# Altium footprint library STM32F0.PcbLib: 228 footprints (part 10 of 16)
Each footprint in its own frame and in the unit in brackets; x right, y up, seen from the top. Pads: shape width x height; smd on the part's side, far side on the other; paste and mask are expansions set on the pad; w line width, h text height; cw(c..) or ccw(c..) is an arc to the next point about the centre after c.
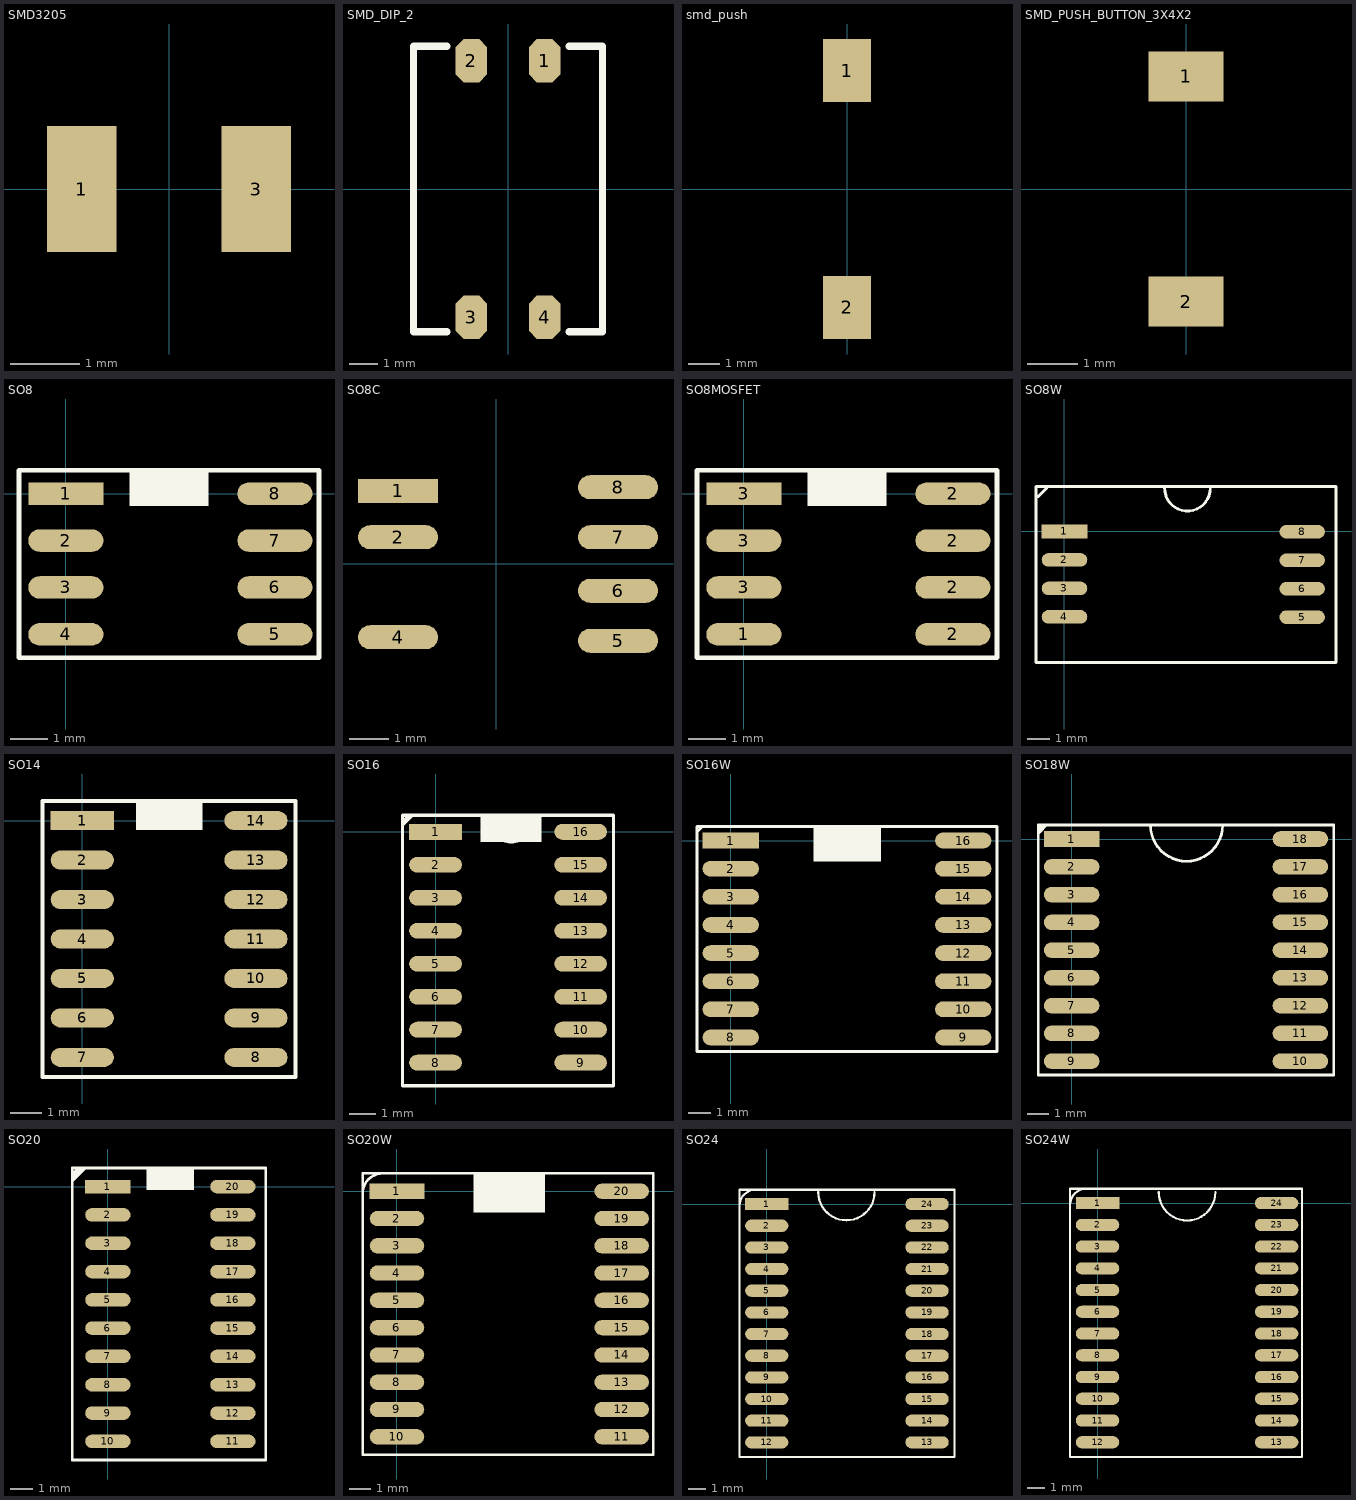
[diagram p9: the footprints below, top view; thin cyan lines are the x and y axes]

## SMD3205 [mm]
pads (2):
  rect 1x1.8 smd: 1(-1.25,0) 3(1.25,0)
3D body "User Library-FX135A-327.step": height 0.9, standoff -0.01, extent -1.6,-0.75 1.6,0.75

## SMD_DIP_2 [mm]
pads (4):
  oct 1.1x1.5 smd: 1(1.27,4.45) 2(-1.27,4.45) 3(-1.27,-4.45) 4(1.27,-4.45)
Top Overlay:
  lines w0.254: -2.125,-4.95 -3.275,-4.95 -3.275,4.95 -2.125,4.95 ; 2.125,-4.95 3.275,-4.95 3.275,4.95 2.125,4.95
3D body "User Library-DIP SW 2P.STEP": height 4.05, standoff -0.1, extent -3.275,-4.95 3.275,4.95

## smd_push [mm]
pads (2):
  rect 1.524x2 smd: 1(0,3.75) 2(0,-3.75)
3D body "User Library-dtsm-32n.step": height 5.5, standoff 0, extent -1.75,-4 1.75,4

## SMD_PUSH_BUTTON_3X4X2 [mm]
pads (2):
  rect 1.5x1 smd: 1(0,2.25) 2(0,-2.25)
3D body "User Library-Pushbutton3x4x2.step": height 2, standoff 0, extent -1.45,-2.45 1.45,2.45

## SO8 [mil]
pads (8):
  rect 80x24 smd: 1(0,0)
  oval 80x24 smd: 2(0,-50) 3(0,-100) 4(0,-150) 5(222.95,-150) 6(222.95,-100) 7(222.95,-50) 8(222.95,0)
Top Overlay:
  rectangle: 68,-13 152,25
  lines w5: -50,-175 -50,25 270,25 270,-175 -50,-175
3D body "SW3DPS-SO-8-DEFAULT.STEP": height 57, standoff 0, extent -1.97,-171.3 225.53,21.7

## SO8C [mil]
pads (7):
  rect 80x24 smd: 1(-98.12,73.05)
  oval 80x24 smd: 2(-98.12,26.59) 4(-98.12,-73.41) 5(121.88,-76.95) 6(121.88,-26.95) 7(121.88,26.59) 8(121.88,76.59)
3D body "User Library-SO-8C.step": height 68.9, standoff 0, extent -105.8,-96.53 130.42,96.38

## SO8MOSFET [mil]
pads (8):
  oval 80x24 smd: 1(0,-150) 2(222.95,-150) 2(222.95,-100) 2(222.95,-50) 2(222.95,0) 3(0,-100) 3(0,-50)
  rect 80x24 smd: 3(0,0)
Top Overlay:
  rectangle: 68,-13 152,25
  lines w5: -50,-175 270,-175 270,25 -50,25 -50,-175
3D body "SW3DPS-SO-8-DEFAULT.STEP": height 57, standoff 0, extent -1.97,-171.3 225.53,21.7

## SO8W [mil]
pads (8):
  rect 80x24 smd: 1(0,0)
  oval 80x24 smd: 2(0,-50) 3(0,-100) 4(0,-150) 5(417.32,-150.59) 6(417.32,-100.59) 7(417.32,-50.59) 8(417.32,-0.59)
Top Overlay:
  lines w5: -46.5,60.79 -31.5,75.79 ; 175.91,75.79 ccw(c215.91,75.79) 255.91,75.79 ; -50,-230.2 -50,79.13 476.69,79.13 476.69,-230.2 -50,-230.2
3D body: height 20, standoff 0, extent 410,-8 437,7
3D body: height 35, standoff 15, extent 391,-8 423.5,7
3D body: height 20, standoff 0, extent 410,-58 437,-43
3D body: height 35, standoff 15, extent 391,-58 423.5,-43
3D body: height 20, standoff 0, extent 410,-108 437,-93
3D body: height 35, standoff 15, extent 391,-108 423.5,-93
3D body: height 35, standoff 15, extent 391,-158 423.5,-143
3D body: height 20, standoff 0, extent 410,-158 437,-143
3D body: height 60, standoff 10, extent 25,-228 392,77
3D body: height 20, standoff 0, extent -20,-8 7,7
3D body: height 35, standoff 15, extent -6.5,-8 26,7
3D body: height 35, standoff 15, extent -6.5,-58 26,-43
3D body: height 20, standoff 0, extent -20,-58 7,-43
3D body: height 35, standoff 15, extent -6.5,-108 26,-93
3D body: height 20, standoff 0, extent -20,-108 7,-93
3D body: height 35, standoff 15, extent -6.5,-158 26,-143
3D body: height 20, standoff 0, extent -20,-158 7,-143

## SO14 [mil]
pads (14):
  rect 80x24 smd: 1(0,0)
  oval 80x24 smd: 2(0,-50) 3(0,-100) 4(0,-150) 5(0,-200) 6(0,-250) 7(0,-300) 8(220,-300) 9(220,-250) 10(220,-200) 11(220,-150) 12(220,-100) 13(220,-50) 14(220,0)
Top Overlay:
  rectangle: 68,-12 152,26
  lines w5: -50.12,-325.02 269.88,-325.02 269.88,24.98 -50.12,24.98 -50.12,-325.02
3D body: height 60, standoff 10, extent 25,-325 195,25
3D body: height 20, standoff 0, extent -20,-8 7,7
3D body: height 35, standoff 15, extent -6.5,-8 26,7
3D body: height 35, standoff 15, extent -6.5,-58 26,-43
3D body: height 20, standoff 0, extent -20,-58 7,-43
3D body: height 35, standoff 15, extent -6.5,-108 26,-93
3D body: height 20, standoff 0, extent -20,-108 7,-93
3D body: height 35, standoff 15, extent -6.5,-158 26,-143
3D body: height 20, standoff 0, extent -20,-158 7,-143
3D body: height 35, standoff 15, extent 194,-157 226.5,-142
3D body: height 20, standoff 0, extent 213,-157 240,-142
3D body: height 35, standoff 15, extent 194,-107 226.5,-92
3D body: height 20, standoff 0, extent 213,-107 240,-92
3D body: height 35, standoff 15, extent 194,-57 226.5,-42
3D body: height 20, standoff 0, extent 213,-57 240,-42
3D body: height 35, standoff 15, extent 194,-7 226.5,8
3D body: height 20, standoff 0, extent 213,-7 240,8
3D body: height 20, standoff 0, extent -20,-208 7,-193
3D body: height 35, standoff 15, extent -6.5,-208 26,-193
3D body: height 35, standoff 15, extent -6.5,-258 26,-243
3D body: height 20, standoff 0, extent -20,-258 7,-243
3D body: height 35, standoff 15, extent -6.5,-308 26,-293
3D body: height 20, standoff 0, extent -20,-308 7,-293
3D body: height 35, standoff 15, extent 194,-307 226.5,-292
3D body: height 20, standoff 0, extent 213,-307 240,-292
3D body: height 35, standoff 15, extent 194,-257 226.5,-242
3D body: height 20, standoff 0, extent 213,-257 240,-242
3D body: height 35, standoff 15, extent 194,-207 226.5,-192
3D body: height 20, standoff 0, extent 213,-207 240,-192
3D body: height 61, standoff 60, extent 36,-9 55.92,10.96
3D body: height 61, standoff 60, extent 68,-12 152,22

## SO16 [mil]
pads (16):
  rect 80x24 smd: 1(0,0)
  oval 80x24 smd: 2(0,-50) 3(0,-100) 4(0,-150) 5(0,-200) 6(0,-250) 7(0,-300) 8(0,-350) 9(220,-350) 10(220,-300) 11(220,-250) 12(220,-200) 13(220,-150) 14(220,-100) 15(220,-50) 16(220,0)
Top Overlay:
  rectangle: 67.91,-15.75 160.43,24.98
  lines w5: -35.12,24.98 -50.12,9.98 -50.12,14.98 -40.12,24.98 -50.12,24.98 ; 74.88,24.98 ccw(c114.88,24.98) 154.88,24.98 ; -50.12,24.98 269.88,24.98 269.88,-385.02 -50.12,-385.02 -50.12,24.98
3D body: height 60, standoff 10, extent 25,-385 195,25
3D body: height 20, standoff 0, extent -20,-8 7,7
3D body: height 35, standoff 15, extent -6.5,-8 26,7
3D body: height 35, standoff 15, extent -6.5,-58 26,-43
3D body: height 20, standoff 0, extent -20,-58 7,-43
3D body: height 35, standoff 15, extent -6.5,-108 26,-93
3D body: height 20, standoff 0, extent -20,-108 7,-93
3D body: height 35, standoff 15, extent -6.5,-158 26,-143
3D body: height 20, standoff 0, extent -20,-158 7,-143
3D body: height 35, standoff 15, extent 194,-157 226.5,-142
3D body: height 20, standoff 0, extent 213,-157 240,-142
3D body: height 35, standoff 15, extent 194,-107 226.5,-92
3D body: height 20, standoff 0, extent 213,-107 240,-92
3D body: height 35, standoff 15, extent 194,-57 226.5,-42
3D body: height 20, standoff 0, extent 213,-57 240,-42
3D body: height 35, standoff 15, extent 194,-7 226.5,8
3D body: height 20, standoff 0, extent 213,-7 240,8
3D body: height 20, standoff 0, extent -20,-208 7,-193
3D body: height 35, standoff 15, extent -6.5,-208 26,-193
3D body: height 35, standoff 15, extent -6.5,-258 26,-243
3D body: height 20, standoff 0, extent -20,-258 7,-243
3D body: height 35, standoff 15, extent -6.5,-308 26,-293
3D body: height 20, standoff 0, extent -20,-308 7,-293
3D body: height 35, standoff 15, extent 194,-307 226.5,-292
3D body: height 20, standoff 0, extent 213,-307 240,-292
3D body: height 35, standoff 15, extent 194,-257 226.5,-242
3D body: height 20, standoff 0, extent 213,-257 240,-242
3D body: height 35, standoff 15, extent 194,-207 226.5,-192
3D body: height 20, standoff 0, extent 213,-207 240,-192
3D body: height 61, standoff 60, extent 36,-9 55.92,10.96
3D body: height 61, standoff 60, extent 68,-12 152,22
3D body: height 20, standoff 0, extent 213,-357 240,-342
3D body: height 35, standoff 15, extent 194,-357 226.5,-342
3D body: height 20, standoff 0, extent -20,-358 7,-343
3D body: height 35, standoff 15, extent -6.5,-358 26,-343

## SO16W [mil]
pads (16):
  rect 100x28 smd: 1(0,0)
  oval 100x28 smd: 2(0,-50) 3(0,-100) 4(0,-150) 5(0,-200) 6(0,-250) 7(0,-300) 8(0,-350) 9(413,-350) 10(413,-300) 11(413,-250) 12(413,-200) 13(413,-150) 14(413,-100) 15(413,-50) 16(413,0)
Top Overlay:
  rectangle: 146.65,-37.4 266.73,25
  lines w5: -60,15 -50,25 -60,25 ; -60,25 -60,-375 473,-375 473,25 -60,25
3D body: height 60, standoff 10, extent 50,-375 362,25
3D body: height 20, standoff 0, extent 5,-8 32,7
3D body: height 35, standoff 15, extent 18.5,-8 51,7
3D body: height 35, standoff 15, extent 18.5,-58 51,-43
3D body: height 20, standoff 0, extent 5,-58 32,-43
3D body: height 35, standoff 15, extent 18.5,-108 51,-93
3D body: height 20, standoff 0, extent 5,-108 32,-93
3D body: height 35, standoff 15, extent 18.5,-158 51,-143
3D body: height 20, standoff 0, extent 5,-158 32,-143
3D body: height 35, standoff 15, extent 361,-157 393.5,-142
3D body: height 20, standoff 0, extent 380,-157 407,-142
3D body: height 35, standoff 15, extent 361,-107 393.5,-92
3D body: height 20, standoff 0, extent 380,-107 407,-92
3D body: height 35, standoff 15, extent 361,-57 393.5,-42
3D body: height 20, standoff 0, extent 380,-57 407,-42
3D body: height 35, standoff 15, extent 361,-7 393.5,8
3D body: height 20, standoff 0, extent 380,-7 407,8
3D body: height 20, standoff 0, extent 5,-208 32,-193
3D body: height 35, standoff 15, extent 18.5,-208 51,-193
3D body: height 35, standoff 15, extent 18.5,-258 51,-243
3D body: height 20, standoff 0, extent 5,-258 32,-243
3D body: height 35, standoff 15, extent 18.5,-308 51,-293
3D body: height 20, standoff 0, extent 5,-308 32,-293
3D body: height 35, standoff 15, extent 361,-307 393.5,-292
3D body: height 20, standoff 0, extent 380,-307 407,-292
3D body: height 35, standoff 15, extent 361,-257 393.5,-242
3D body: height 20, standoff 0, extent 380,-257 407,-242
3D body: height 35, standoff 15, extent 361,-207 393.5,-192
3D body: height 20, standoff 0, extent 380,-207 407,-192
3D body: height 61, standoff 60, extent 68.08,-10.98 88,8.98
3D body: height 61, standoff 60, extent 140,-39 271,27
3D body: height 20, standoff 0, extent 380,-357 407,-342
3D body: height 35, standoff 15, extent 361,-357 393.5,-342
3D body: height 20, standoff 0, extent 5,-358 32,-343
3D body: height 35, standoff 15, extent 18.5,-358 51,-343

## SO18W [mil]
pads (18):
  rect 100x28 smd: 1(0,0)
  oval 100x28 smd: 2(0,-50) 3(0,-100) 4(0,-150) 5(0,-200) 6(0,-250) 7(0,-300) 8(0,-350) 9(0,-400) 10(412,-400) 11(412,-350) 12(412,-300) 13(412,-250) 14(412,-200) 15(412,-150) 16(412,-100) 17(412,-50) 18(412,0)
Top Overlay:
  lines w5: -52.47,17.53 -59.93,25 -60,25 ; -50,25 -60,15 -60,25 ; 142,25 ccw(c207,25) 272,25 ; -60,25 472,25 472,-425 -60,-425 -60,25 ; -60,25 -60,10 -45,25 -60,25
3D body: height 20, standoff 0, extent 380,-406.5 407,-391.5
3D body: height 35, standoff 15, extent 361,-406.5 393.5,-391.5
3D body: height 20, standoff 0, extent 5,-407.5 32,-392.5
3D body: height 35, standoff 15, extent 18.5,-407.5 51,-392.5
3D body: height 35, standoff 15, extent 18.5,-358.5 51,-343.5
3D body: height 20, standoff 0, extent 5,-358.5 32,-343.5
3D body: height 35, standoff 15, extent 361,-357.5 393.5,-342.5
3D body: height 20, standoff 0, extent 380,-357.5 407,-342.5
3D body: height 61, standoff 60, extent 140,-39.5 271,26.5
3D body: height 61, standoff 60, extent 68.08,-11.48 88,8.48
3D body: height 20, standoff 0, extent 380,-207.5 407,-192.5
3D body: height 35, standoff 15, extent 361,-207.5 393.5,-192.5
3D body: height 20, standoff 0, extent 380,-257.5 407,-242.5
3D body: height 35, standoff 15, extent 361,-257.5 393.5,-242.5
3D body: height 20, standoff 0, extent 380,-307.5 407,-292.5
3D body: height 35, standoff 15, extent 361,-307.5 393.5,-292.5
3D body: height 20, standoff 0, extent 5,-308.5 32,-293.5
3D body: height 35, standoff 15, extent 18.5,-308.5 51,-293.5
3D body: height 20, standoff 0, extent 5,-258.5 32,-243.5
3D body: height 35, standoff 15, extent 18.5,-258.5 51,-243.5
3D body: height 35, standoff 15, extent 18.5,-208.5 51,-193.5
3D body: height 20, standoff 0, extent 5,-208.5 32,-193.5
3D body: height 20, standoff 0, extent 380,-7.5 407,7.5
3D body: height 35, standoff 15, extent 361,-7.5 393.5,7.5
3D body: height 20, standoff 0, extent 380,-57.5 407,-42.5
3D body: height 35, standoff 15, extent 361,-57.5 393.5,-42.5
3D body: height 20, standoff 0, extent 380,-107.5 407,-92.5
3D body: height 35, standoff 15, extent 361,-107.5 393.5,-92.5
3D body: height 20, standoff 0, extent 380,-157.5 407,-142.5
3D body: height 35, standoff 15, extent 361,-157.5 393.5,-142.5
3D body: height 20, standoff 0, extent 5,-158.5 32,-143.5
3D body: height 35, standoff 15, extent 18.5,-158.5 51,-143.5
3D body: height 20, standoff 0, extent 5,-108.5 32,-93.5
3D body: height 35, standoff 15, extent 18.5,-108.5 51,-93.5
3D body: height 20, standoff 0, extent 5,-58.5 32,-43.5
3D body: height 35, standoff 15, extent 18.5,-58.5 51,-43.5
3D body: height 35, standoff 15, extent 18.5,-8.5 51,6.5
3D body: height 20, standoff 0, extent 5,-8.5 32,6.5
3D body: height 60, standoff 10, extent 50,-425 362,24.5

## SO20 [mil]
pads (20):
  rect 80x24 smd: 1(0,0)
  oval 80x24 smd: 2(0,-50) 3(0,-100) 4(0,-150) 5(0,-200) 6(0,-250) 7(0,-300) 8(0,-350) 9(0,-400) 10(0,-450) 11(220.81,-450) 12(220.81,-400) 13(220.81,-350) 14(220.81,-300) 15(220.81,-250) 16(220.81,-200) 17(220.81,-150) 18(220.81,-100) 19(220.81,-50) 20(220.81,0)
Top Overlay:
  rectangle: 68,-6 152,33
  lines w5: -63,-20 -63,-4 ; -40,33 -63,10 -63,14 -45,32 -45,33 -48,33 -63,18 -63,22 -52,33 ; -63,33 279,33 279,-483 -63,-483 -63,33 ; -63,33 -52,33 ; -63,33 -52,33
3D body: height 20, standoff 0, extent 213,-457 240,-442
3D body: height 35, standoff 15, extent 194,-457 226.5,-442
3D body: height 20, standoff 0, extent -20,-458 7,-443
3D body: height 35, standoff 15, extent -6.5,-458 26,-443
3D body: height 20, standoff 0, extent 213,-407 240,-392
3D body: height 35, standoff 15, extent 194,-407 226.5,-392
3D body: height 20, standoff 0, extent -20,-408 7,-393
3D body: height 35, standoff 15, extent -6.5,-408 26,-393
3D body: height 35, standoff 15, extent -6.5,-358 26,-343
3D body: height 20, standoff 0, extent -20,-358 7,-343
3D body: height 35, standoff 15, extent 194,-357 226.5,-342
3D body: height 20, standoff 0, extent 213,-357 240,-342
3D body: height 61, standoff 60, extent 68,-6 152,28
3D body: height 61, standoff 60, extent 36,-3 55.92,16.96
3D body: height 20, standoff 0, extent 213,-207 240,-192
3D body: height 35, standoff 15, extent 194,-207 226.5,-192
3D body: height 20, standoff 0, extent 213,-257 240,-242
3D body: height 35, standoff 15, extent 194,-257 226.5,-242
3D body: height 20, standoff 0, extent 213,-307 240,-292
3D body: height 35, standoff 15, extent 194,-307 226.5,-292
3D body: height 20, standoff 0, extent -20,-308 7,-293
3D body: height 35, standoff 15, extent -6.5,-308 26,-293
3D body: height 20, standoff 0, extent -20,-258 7,-243
3D body: height 35, standoff 15, extent -6.5,-258 26,-243
3D body: height 35, standoff 15, extent -6.5,-208 26,-193
3D body: height 20, standoff 0, extent -20,-208 7,-193
3D body: height 20, standoff 0, extent 213,-7 240,8
3D body: height 35, standoff 15, extent 194,-7 226.5,8
3D body: height 20, standoff 0, extent 213,-57 240,-42
3D body: height 35, standoff 15, extent 194,-57 226.5,-42
3D body: height 20, standoff 0, extent 213,-107 240,-92
3D body: height 35, standoff 15, extent 194,-107 226.5,-92
3D body: height 20, standoff 0, extent 213,-157 240,-142
3D body: height 35, standoff 15, extent 194,-157 226.5,-142
3D body: height 20, standoff 0, extent -20,-158 7,-143
3D body: height 35, standoff 15, extent -6.5,-158 26,-143
3D body: height 20, standoff 0, extent -20,-108 7,-93
3D body: height 35, standoff 15, extent -6.5,-108 26,-93
3D body: height 20, standoff 0, extent -20,-58 7,-43
3D body: height 35, standoff 15, extent -6.5,-58 26,-43
3D body: height 35, standoff 15, extent -6.5,-8 26,7
3D body: height 20, standoff 0, extent -20,-8 7,7
3D body: height 60, standoff 10, extent 25,-483 195,33

## SO20W [mil]
pads (20):
  rect 100x28 smd: 1(0,0)
  oval 100x28 smd: 2(0,-50) 3(0,-100) 4(0,-150) 5(0,-200) 6(0,-250) 7(0,-300) 8(0,-350) 9(0,-400) 10(0,-450) 11(411.81,-450) 12(411.81,-400) 13(411.81,-350) 14(411.81,-300) 15(411.81,-250) 16(411.81,-200) 17(411.81,-150) 18(411.81,-100) 19(411.81,-50) 20(411.81,0)
Top Overlay:
  rectangle: 140,-39 271,33
  lines w5: -63,-20 -63,-4 cw(c-26,-4) -26,33 ; -63,-483 470,-483 470,33 -63,33 -63,-483
3D body: height 20, standoff 0, extent 380,-457 407,-442
3D body: height 35, standoff 15, extent 361,-457 393.5,-442
3D body: height 20, standoff 0, extent 5,-458 32,-443
3D body: height 35, standoff 15, extent 18.5,-458 51,-443
3D body: height 20, standoff 0, extent 380,-407 407,-392
3D body: height 35, standoff 15, extent 361,-407 393.5,-392
3D body: height 20, standoff 0, extent 5,-408 32,-393
3D body: height 35, standoff 15, extent 18.5,-408 51,-393
3D body: height 35, standoff 15, extent 18.5,-358 51,-343
3D body: height 20, standoff 0, extent 5,-358 32,-343
3D body: height 35, standoff 15, extent 361,-357 393.5,-342
3D body: height 20, standoff 0, extent 380,-357 407,-342
3D body: height 61, standoff 60, extent 140,-39 271,27
3D body: height 61, standoff 60, extent 68.08,-10.98 88,8.98
3D body: height 20, standoff 0, extent 380,-207 407,-192
3D body: height 35, standoff 15, extent 361,-207 393.5,-192
3D body: height 20, standoff 0, extent 380,-257 407,-242
3D body: height 35, standoff 15, extent 361,-257 393.5,-242
3D body: height 20, standoff 0, extent 380,-307 407,-292
3D body: height 35, standoff 15, extent 361,-307 393.5,-292
3D body: height 20, standoff 0, extent 5,-308 32,-293
3D body: height 35, standoff 15, extent 18.5,-308 51,-293
3D body: height 20, standoff 0, extent 5,-258 32,-243
3D body: height 35, standoff 15, extent 18.5,-258 51,-243
3D body: height 35, standoff 15, extent 18.5,-208 51,-193
3D body: height 20, standoff 0, extent 5,-208 32,-193
3D body: height 20, standoff 0, extent 380,-7 407,8
3D body: height 35, standoff 15, extent 361,-7 393.5,8
3D body: height 20, standoff 0, extent 380,-57 407,-42
3D body: height 35, standoff 15, extent 361,-57 393.5,-42
3D body: height 20, standoff 0, extent 380,-107 407,-92
3D body: height 35, standoff 15, extent 361,-107 393.5,-92
3D body: height 20, standoff 0, extent 380,-157 407,-142
3D body: height 35, standoff 15, extent 361,-157 393.5,-142
3D body: height 20, standoff 0, extent 5,-158 32,-143
3D body: height 35, standoff 15, extent 18.5,-158 51,-143
3D body: height 20, standoff 0, extent 5,-108 32,-93
3D body: height 35, standoff 15, extent 18.5,-108 51,-93
3D body: height 20, standoff 0, extent 5,-58 32,-43
3D body: height 35, standoff 15, extent 18.5,-58 51,-43
3D body: height 35, standoff 15, extent 18.5,-8 51,7
3D body: height 20, standoff 0, extent 5,-8 32,7
3D body: height 60, standoff 10, extent 50,-483 362,33

## SO24 [mil]
pads (24):
  rect 100x28 smd: 1(0,0)
  oval 100x28 smd: 2(0,-50) 3(0,-100) 4(0,-150) 5(0,-200) 6(0,-250) 7(0,-300) 8(0,-350) 9(0,-400) 10(0,-450) 11(0,-500) 12(0,-550) 13(370.08,-550) 14(370.08,-500) 15(370.08,-450) 16(370.08,-400) 17(370.08,-350) 18(370.08,-300) 19(370.08,-250) 20(370.08,-200) 21(370.08,-150) 22(370.08,-100) 23(370.08,-50) 24(370.08,0)
Top Overlay:
  lines w5: -63,-20 -63,-4 cw(c-26,-4) -26,33 ; 118.86,27.56 ccw(c183.86,27.56) 248.86,27.56 ; -63,-584 433.46,-584 433.46,33 -63,33 -63,-584
3D body: height 20, standoff 0, extent 361.25,-456.39 388.25,-441.39
3D body: height 35, standoff 15, extent 342.25,-456.39 374.75,-441.39
3D body: height 20, standoff 0, extent -15.72,-455.43 11.28,-440.43
3D body: height 35, standoff 15, extent -2.22,-455.43 30.28,-440.43
3D body: height 20, standoff 0, extent 361.25,-406.39 388.25,-391.39
3D body: height 35, standoff 15, extent 342.25,-406.39 374.75,-391.39
3D body: height 20, standoff 0, extent -15.72,-405.43 11.28,-390.43
3D body: height 35, standoff 15, extent -2.22,-405.43 30.28,-390.43
3D body: height 35, standoff 15, extent -2.22,-355.43 30.28,-340.43
3D body: height 20, standoff 0, extent -15.72,-355.43 11.28,-340.43
3D body: height 35, standoff 15, extent 342.25,-356.39 374.75,-341.39
3D body: height 20, standoff 0, extent 361.25,-356.39 388.25,-341.39
3D body: height 61, standoff 60, extent 117.33,-38 248.33,28
3D body: height 61, standoff 60, extent 65.08,-9.98 85,9.98
3D body: height 20, standoff 0, extent 361.25,-206.39 388.25,-191.39
3D body: height 35, standoff 15, extent 342.25,-206.39 374.75,-191.39
3D body: height 20, standoff 0, extent 361.25,-256.39 388.25,-241.39
3D body: height 35, standoff 15, extent 342.25,-256.39 374.75,-241.39
3D body: height 20, standoff 0, extent 361.25,-306.39 388.25,-291.39
3D body: height 35, standoff 15, extent 342.25,-306.39 374.75,-291.39
3D body: height 20, standoff 0, extent -15.72,-305.43 11.28,-290.43
3D body: height 35, standoff 15, extent -2.22,-305.43 30.28,-290.43
3D body: height 20, standoff 0, extent -15.72,-255.43 11.28,-240.43
3D body: height 35, standoff 15, extent -2.22,-255.43 30.28,-240.43
3D body: height 35, standoff 15, extent -2.22,-205.43 30.28,-190.43
3D body: height 20, standoff 0, extent -15.72,-205.43 11.28,-190.43
3D body: height 20, standoff 0, extent 361.25,-6.39 388.25,8.61
3D body: height 35, standoff 15, extent 342.25,-6.39 374.75,8.61
3D body: height 20, standoff 0, extent 361.25,-56.39 388.25,-41.39
3D body: height 35, standoff 15, extent 342.25,-56.39 374.75,-41.39
3D body: height 20, standoff 0, extent 361.25,-106.39 388.25,-91.39
3D body: height 35, standoff 15, extent 342.25,-106.39 374.75,-91.39
3D body: height 20, standoff 0, extent 361.25,-156.39 388.25,-141.39
3D body: height 35, standoff 15, extent 342.25,-156.39 374.75,-141.39
3D body: height 20, standoff 0, extent -15.72,-155.43 11.28,-140.43
3D body: height 35, standoff 15, extent -2.22,-155.43 30.28,-140.43
3D body: height 20, standoff 0, extent -15.72,-105.43 11.28,-90.43
3D body: height 35, standoff 15, extent -2.22,-105.43 30.28,-90.43
3D body: height 20, standoff 0, extent -15.72,-55.43 11.28,-40.43
3D body: height 35, standoff 15, extent -2.22,-55.43 30.28,-40.43
3D body: height 35, standoff 15, extent -2.22,-5.43 30.28,9.57
3D body: height 20, standoff 0, extent -15.72,-5.43 11.28,9.57
3D body: height 60, standoff 10, extent 27.31,-583 339.31,34
3D body: height 35, standoff 15, extent -5.22,-507.43 27.28,-492.43
3D body: height 20, standoff 0, extent -18.72,-507.43 8.28,-492.43
3D body: height 35, standoff 15, extent 339.25,-508.39 371.75,-493.39
3D body: height 20, standoff 0, extent 358.25,-508.39 385.25,-493.39
3D body: height 35, standoff 15, extent -5.22,-557.43 27.28,-542.43
3D body: height 20, standoff 0, extent -18.72,-557.43 8.28,-542.43
3D body: height 35, standoff 15, extent 339.25,-558.39 371.75,-543.39
3D body: height 20, standoff 0, extent 358.25,-558.39 385.25,-543.39

## SO24W [mil]
pads (24):
  rect 100x28 smd: 1(0,0)
  oval 100x28 smd: 2(0,-50) 3(0,-100) 4(0,-150) 5(0,-200) 6(0,-250) 7(0,-300) 8(0,-350) 9(0,-400) 10(0,-450) 11(0,-500) 12(0,-550) 13(411.81,-550) 14(411.81,-500) 15(411.81,-450) 16(411.81,-400) 17(411.81,-350) 18(411.81,-300) 19(411.81,-250) 20(411.81,-200) 21(411.81,-150) 22(411.81,-100) 23(411.81,-50) 24(411.81,0)
Top Overlay:
  lines w5: -63,-20 -63,-4 cw(c-26,-4) -26,33 ; 141,25 ccw(c206,25) 271,25 ; -63,-584 470,-584 470,33 -63,33 -63,-584
3D body: height 20, standoff 0, extent 377,-456 404,-441
3D body: height 35, standoff 15, extent 358,-456 390.5,-441
3D body: height 20, standoff 0, extent 2,-457 29,-442
3D body: height 35, standoff 15, extent 15.5,-457 48,-442
3D body: height 20, standoff 0, extent 377,-406 404,-391
3D body: height 35, standoff 15, extent 358,-406 390.5,-391
3D body: height 20, standoff 0, extent 2,-407 29,-392
3D body: height 35, standoff 15, extent 15.5,-407 48,-392
3D body: height 35, standoff 15, extent 15.5,-357 48,-342
3D body: height 20, standoff 0, extent 2,-357 29,-342
3D body: height 35, standoff 15, extent 358,-356 390.5,-341
3D body: height 20, standoff 0, extent 377,-356 404,-341
3D body: height 61, standoff 60, extent 137,-38 268,28
3D body: height 61, standoff 60, extent 65.08,-9.98 85,9.98
3D body: height 20, standoff 0, extent 377,-206 404,-191
3D body: height 35, standoff 15, extent 358,-206 390.5,-191
3D body: height 20, standoff 0, extent 377,-256 404,-241
3D body: height 35, standoff 15, extent 358,-256 390.5,-241
3D body: height 20, standoff 0, extent 377,-306 404,-291
3D body: height 35, standoff 15, extent 358,-306 390.5,-291
3D body: height 20, standoff 0, extent 2,-307 29,-292
3D body: height 35, standoff 15, extent 15.5,-307 48,-292
3D body: height 20, standoff 0, extent 2,-257 29,-242
3D body: height 35, standoff 15, extent 15.5,-257 48,-242
3D body: height 35, standoff 15, extent 15.5,-207 48,-192
3D body: height 20, standoff 0, extent 2,-207 29,-192
3D body: height 20, standoff 0, extent 377,-6 404,9
3D body: height 35, standoff 15, extent 358,-6 390.5,9
3D body: height 20, standoff 0, extent 377,-56 404,-41
3D body: height 35, standoff 15, extent 358,-56 390.5,-41
3D body: height 20, standoff 0, extent 377,-106 404,-91
3D body: height 35, standoff 15, extent 358,-106 390.5,-91
3D body: height 20, standoff 0, extent 377,-156 404,-141
3D body: height 35, standoff 15, extent 358,-156 390.5,-141
3D body: height 20, standoff 0, extent 2,-157 29,-142
3D body: height 35, standoff 15, extent 15.5,-157 48,-142
3D body: height 20, standoff 0, extent 2,-107 29,-92
3D body: height 35, standoff 15, extent 15.5,-107 48,-92
3D body: height 20, standoff 0, extent 2,-57 29,-42
3D body: height 35, standoff 15, extent 15.5,-57 48,-42
3D body: height 35, standoff 15, extent 15.5,-7 48,8
3D body: height 20, standoff 0, extent 2,-7 29,8
3D body: height 60, standoff 10, extent 47,-583 359,34
3D body: height 35, standoff 15, extent 12.5,-509 45,-494
3D body: height 20, standoff 0, extent -1,-509 26,-494
3D body: height 35, standoff 15, extent 355,-508 387.5,-493
3D body: height 20, standoff 0, extent 374,-508 401,-493
3D body: height 35, standoff 15, extent 12.5,-559 45,-544
3D body: height 20, standoff 0, extent -1,-559 26,-544
3D body: height 35, standoff 15, extent 355,-558 387.5,-543
3D body: height 20, standoff 0, extent 374,-558 401,-543